# Altium footprint library 2.52-直插元件.PcbLib: 467 footprints (part 27 of 30)
Each footprint in its own frame and in the unit in brackets; x right, y up, seen from the top. Pads: shape width x height; smd on the part's side, far side on the other; paste and mask are expansions set on the pad; w line width, h text height; cw(c..) or ccw(c..) is an arc to the next point about the centre after c.
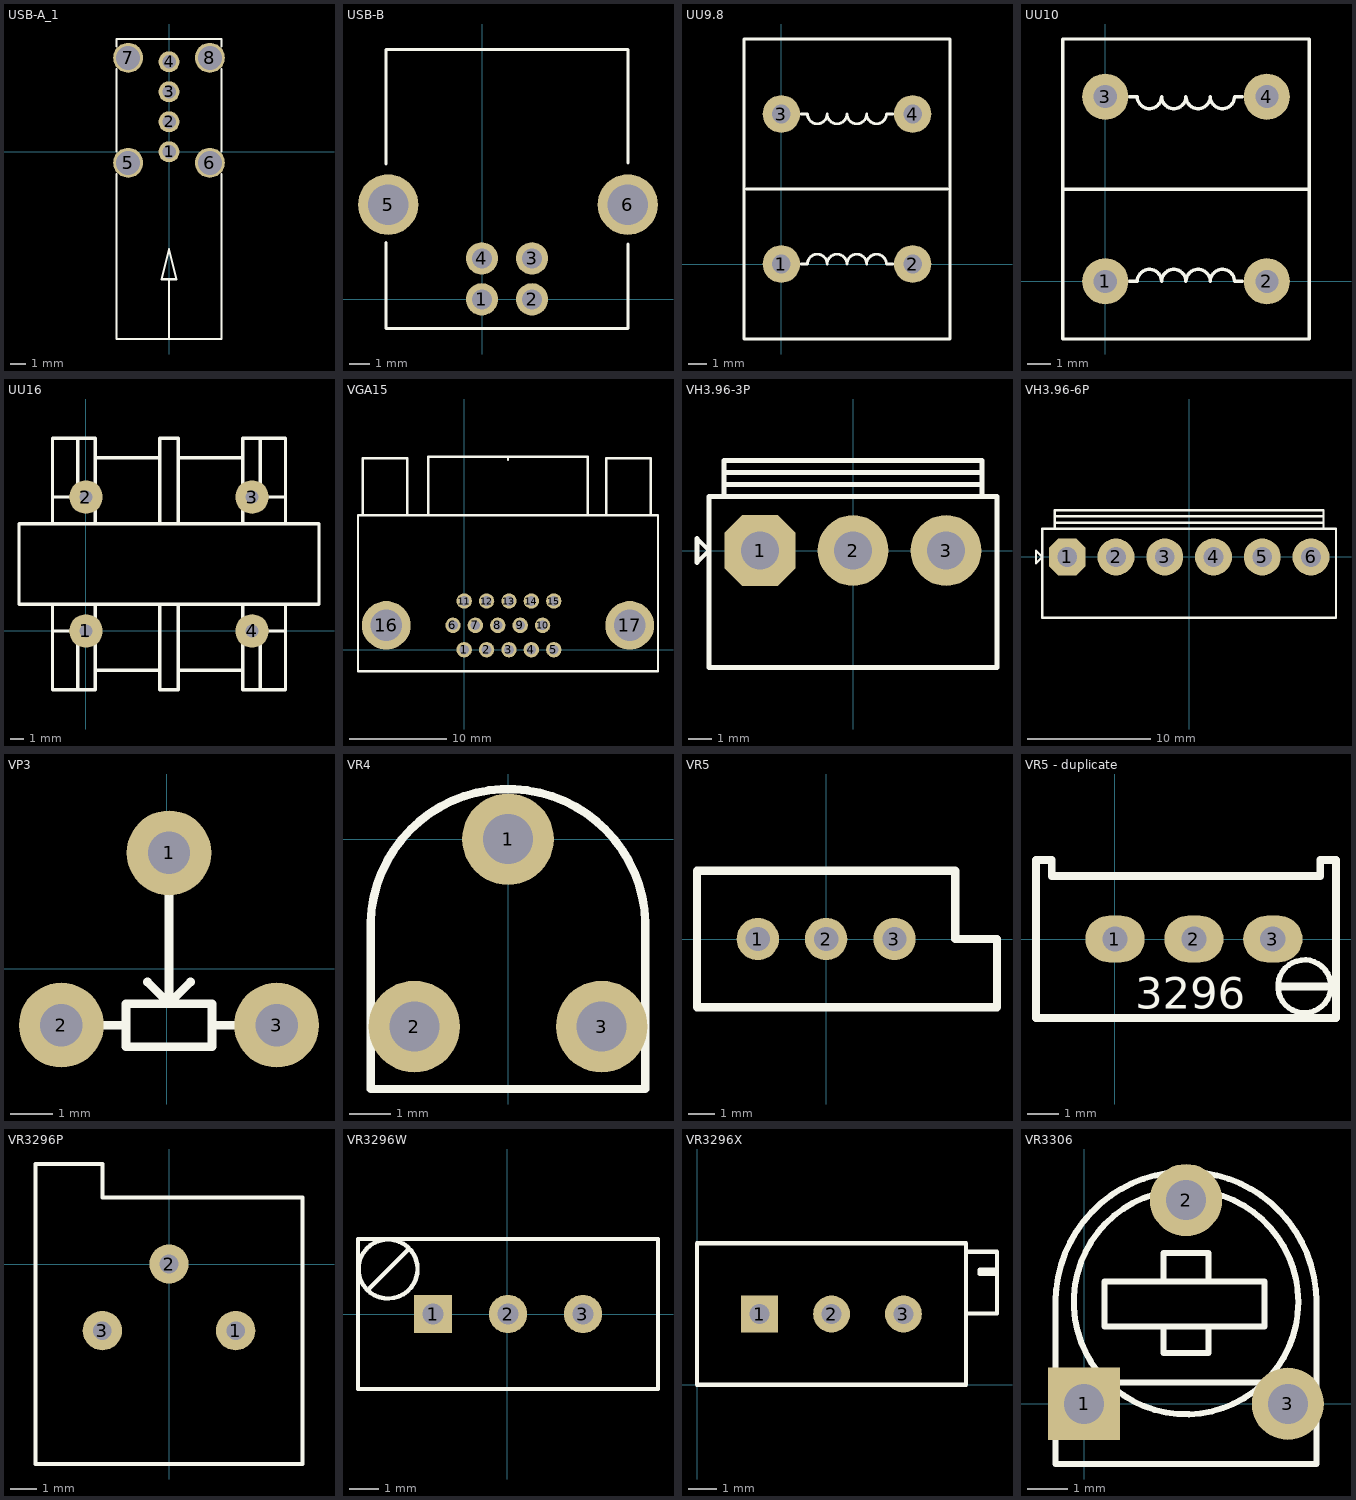
[diagram p26: the footprints below, top view; thin cyan lines are the x and y axes]

## USB-A_1 [mm] "封装库来自淘宝卖家 ID：黄晶宝石"
pads (8):
  round 1.4 hole 0.9: 1(-0.011,-0.003) 2(-0.011,1.997) 3(-0.011,3.997) 4(-0.011,5.997)
  round 2 hole 1.6: 5(-2.731,-0.733) 6(2.709,-0.733) 7(-2.731,6.267) 8(2.709,6.267)
Top Overlay:
  lines w0.15: -3.511,-1.483 -3.511,-12.483 3.489,-12.483 3.489,-1.483 ; -3.511,0.017 -3.511,5.517 ; -3.511,7.017 -3.511,7.517 3.489,7.517 3.489,7.017 ; -0.011,-12.483 -0.011,-8.503 ; 3.489,0.017 3.489,5.517 ; -0.511,-8.503 -0.011,-6.503 0.489,-8.503 -0.511,-8.503
3D body "User Library-USB-STRT-CONN.step": height 14.6, standoff -0.87, extent -3.511,-12.324 3.489,7.026

## USB-B [mil] "封装库来自淘宝卖家 ID：黄晶宝石"
pads (6):
  round 63 hole 39: 1(-0.5,0.04) 2(97.5,0.04) 3(97.5,80.04) 4(-0.5,80.04)
  round 118 hole 78.74: 5(-183.5,185.04) 6(284.5,185.04)
Top Overlay:
  lines w5.91: -187.5,110.54 -187.5,-56.96 284.5,-56.96 284.5,108.54 ; -187.5,264.54 -187.5,488.04 284.5,488.04 284.5,266.54
3D body "User Library-67068-0000-molex.step": height 433.07, standoff -174.07, extent -243.93,-78.42 342.04,590.87

## UU9.8 [mm]
pads (4):
  round 2 hole 1: 1(0,0) 2(7,0) 3(0,8) 4(7,8)
Top Overlay:
  lines w0.15: -2,-4 9,-4 ; -2,-3.991 -2,12 9,12 9,-3.991 ; -1.851,3.998 8.847,3.998 ; 1.045,-0.007 1.388,-0.007 cw(c1.915,-0.007) 2.442,-0.007 cw(c2.969,-0.007) 3.496,-0.007 cw(c4.023,-0.007) 4.55,-0.007 cw(c5.077,-0.007) 5.604,-0.007 5.947,-0.007 ; 1.045,8.007 1.388,8.007 ccw(c1.915,8.007) 2.442,8.007 ccw(c2.969,8.007) 3.496,8.007 ccw(c4.023,8.007) 4.55,8.007 ccw(c5.077,8.007) 5.604,8.007 5.947,8.007
3D body "User Library-emi filter-1.step": height 16.04, standoff -2.96, extent -1.75,-3.746 8.75,11.755

## UU10 [mm] "淘宝ID:黄晶宝石   店铺网址:https://shop463601444.taobao.com"
pads (4):
  round 2 hole 1: 1(0,0) 2(7,0) 3(0,8) 4(7,8)
Top Overlay:
  lines w0.15: -1.851,3.998 8.847,3.998 ; -1.851,10.5 -1.847,-2.5 8.847,-2.5 8.847,10.5 -1.847,10.5 ; 1.045,-0.007 1.388,-0.007 cw(c1.915,-0.007) 2.442,-0.007 cw(c2.969,-0.007) 3.496,-0.007 cw(c4.023,-0.007) 4.55,-0.007 cw(c5.077,-0.007) 5.604,-0.007 5.947,-0.007 ; 1.045,8.007 1.388,8.007 ccw(c1.915,8.007) 2.442,8.007 ccw(c2.969,8.007) 3.496,8.007 ccw(c4.023,8.007) 4.55,8.007 ccw(c5.077,8.007) 5.604,8.007 5.947,8.007
3D body "UU10.STEP": height 15.45, standoff -3, extent -1.925,-3.782 8.925,11.782

## UU16 [mm] "封装库来自淘宝卖家 ID：黄晶宝石"
pads (4):
  round 2.5 hole 1: 1(0,0) 2(0,10) 3(12.4,10) 4(12.4,0)
Top Overlay:
  lines w0.254: -2.5,8 -2.5,9.996 ; 0.7,-2.923 5.5,-2.923 ; 0.7,2 0.7,-4.4 -0.6,-4.4 ; 0.7,8 0.7,14.4 -0.6,14.4 ; 0.7,12.923 5.5,12.923 ; 5.5,2 5.5,-4.4 6.9,-4.4 6.9,2 ; 5.5,8 5.5,14.4 6.9,14.4 6.9,8 ; 6.9,-2.923 11.7,-2.923 ; 6.9,12.923 11.7,12.923 ; 11.7,2 11.7,-4.4 13,-4.4 ; 11.7,8 11.7,14.4 13,14.4 ; -2.5,0 -2.5,2 -2.5,0.004 ; -2.5,0 -2.5,0.004 ; -2.5,0 -0.6,0 -0.6,-4.4 ; -2.5,0 -2.5,0.004 ; -2.5,0.004 -2.5,-4.4 -0.6,-4.4 ; -2.5,9.996 -2.5,10 -0.6,10 -0.6,14.4 ; -2.5,9.996 -2.5,14.4 -0.6,14.4 ; 13,-4.4 13,0 14.9,0 ; 13,-4.4 14.9,-4.4 14.9,0.004 ; 13,14.4 13,10 14.9,10 ; 13,14.4 14.9,14.4 14.9,9.996 ; 14.9,0 14.9,2 14.9,0.004 ; 14.9,0 14.9,0.004 ; 14.9,0 14.9,0.004 ; 14.9,9.996 14.9,10 ; 14.9,9.996 14.9,8 14.9,10 ; 14.9,9.996 14.9,10 ; -5,2 -5,8 17.4,8 17.4,2 -5,2
3D body "UU16.STEP": height 25.55, standoff -3.8, extent -4.917,-4.35 17.317,14.35

## VGA15 [mm]
pads (17):
  round 1.58 hole 1: 1(0,0) 2(2.3,0) 3(4.6,0) 4(6.9,0) 5(9.2,0) 6(-1.15,2.5) 7(1.15,2.5) 8(3.45,2.5) 9(5.75,2.5) 10(8.05,2.5) 11(0,5) 12(2.3,5) 13(4.6,5) 14(6.9,5) 15(9.2,5)
  round 5 hole 3.25: 16(-8,2.5) 17(17,2.5)
Top Overlay:
  lines w0.254: -10.9,-2.2 -10.9,13.8 19.9,13.8 19.9,-2.2 -10.89,-2.2 -10.9,-2.19 ; -10.4,13.8 -10.4,19.67 -5.83,19.67 -5.83,13.82 ; -3.7,13.8 -3.7,19.8 12.7,19.8 12.7,13.8 ; 4.5,19.5 4.5,19.8 ; 14.6,13.8 14.6,19.68 19.18,19.68 19.18,13.84
3D body "SW3dPS-Connector, D-Sub, 15 pin HD, RA, Receptacle.STEP": height 12.77, standoff -3.27, extent -11.055,-0.875 19.755,20.225

## VH3.96-3P [mm] "VH3.96接插件"
height 1.5
pads (3):
  oct 3x3 hole 1.6: 1(-3.937,0)
  round 3 hole 1.6: 2(0,0) 3(3.937,0)
Top Overlay:
  lines w0.2: -5.461,2.286 -5.461,3.81 5.461,3.81 5.461,2.286 ; -5.461,2.794 5.461,2.794 ; -5.461,3.302 5.461,3.302 ; -6.604,-0.508 -6.604,0.508 -6.096,0 -6.604,-0.508 ; -6.096,-4.953 6.096,-4.953 6.096,2.286 -6.096,2.286 -6.096,-4.953

## VH3.96-6P [mm] "CH3.96接插件"
height 1.5
pads (6):
  oct 3x3 hole 1.6: 1(-9.906,0)
  round 3 hole 1.6: 2(-5.944,0) 3(-1.981,0) 4(1.981,0) 5(5.944,0) 6(9.906,0)
Top Overlay:
  lines w0.2: -10.922,2.286 -10.922,3.81 10.922,3.81 10.922,2.286 ; -10.922,2.794 10.922,2.794 ; -10.922,3.302 10.922,3.302 ; -12.446,-0.508 -12.446,0.508 -11.938,0 -12.446,-0.508 ; -11.938,-4.953 11.938,-4.953 11.938,2.286 -11.938,2.286 -11.938,-4.953

## VP3 [mm]
pads (3):
  round 2 hole 1: 1(0.052,2.739) 2(-2.488,-1.325) 3(2.592,-1.325)
Top Overlay:
  lines w0.203: -2.488,-1.325 -0.964,-1.325 ; -0.456,-0.309 0.052,-0.817 ; 0.052,2.739 0.052,-0.817 ; 0.56,-0.309 0.052,-0.817 ; 1.068,-1.325 2.592,-1.325 ; -0.964,-1.325 -0.964,-0.817 1.068,-0.817 1.068,-1.833 -0.964,-1.833 -0.964,-1.325

## VR4 [mm]
pads (3):
  round 2.2 hole 1.2: 1(0,0) 2(-2.25,-4.5) 3(2.25,-4.5)
Top Overlay:
  lines w0.2: -3.3,-6 -3.3,-2 cw(c0,-2.095) 3.3,-2 3.3,-6 -3.3,-6

## VR5 [mil]
pads (3):
  round 62 hole 35.43: 1(-100,0) 2(0,0) 3(100,0)
Top Overlay:
  lines w12: -188.98,-100 -188.98,100 188.98,100 188.98,0 250,0 250,-100 -188.98,-100

## VR5 - duplicate [mm] "封装库来自淘宝卖家 ID：黄晶宝石"
pads (3):
  oval 1.905x1.5 hole 0.813: 1(0,0) 2(2.54,0) 3(5.08,0)
Top Overlay:
  circle w0.178: c6.096,-1.524 r0.852
  lines w0.254: 5.334,-1.524 6.948,-1.524 ; -2.54,-2.54 -2.54,2.54 -2.032,2.54 -2.032,2.032 6.604,2.032 6.604,2.54 7.112,2.54 7.112,-2.54 -2.54,-2.54
  text "3296" at 0.65,-2.25 h1.02
3D body "User Library-67W.STEP": height 12.18, standoff -4.09, extent -2.309,-2.461 7.491,2.489

## VR3296P [mm]
pads (3):
  round 1.5 hole 0.711: 1(2.54,-2.54) 2(0,0) 3(-2.54,-2.54)
Top Overlay:
  lines w0.15: -5.08,-7.62 -5.08,3.81 -2.54,3.81 -2.54,2.54 5.08,2.54 5.08,-7.62 -5.08,-7.62
3D body "3296P.step": height 4.4, standoff -8.69, extent -4.765,-7.776 4.765,3.774

## VR3296W [mm]
pads (3):
  rect 1.3x1.3 hole 0.711: 1(-2.515,0)
  round 1.3 hole 0.711: 2(0.025,0) 3(2.565,0)
Top Overlay:
  circle w0.15: c-4.039,1.524 r1
  lines w0.15: -4.665,0.876 -3.388,2.153 ; -5.055,-2.54 -5.055,0 -5.055,2.54 5.105,2.54 5.105,-2.54 -5.055,-2.54
3D body "3296W.step": height 11.55, standoff -6.4, extent -4.74,-2.415 4.79,2.415

## VR3296X [mm]
pads (3):
  rect 1.3x1.3 hole 0.711: 1(2.21,2.5)
  round 1.3 hole 0.711: 2(4.75,2.5) 3(7.29,2.5)
Top Overlay:
  lines w0.15: 9.5,2.515 10.592,2.515 10.592,4.699 9.5,4.699 ; 10.592,3.2 10.592,3.912 9.982,3.912 9.982,4.064 10.592,4.064 ; 0,0 0,5 9.5,5 9.5,0 0,0
3D body "3296X.step": height 10.03, standoff -6.4, extent -0.013,0.084 11.037,4.915

## VR3306 [mm]
pads (3):
  rect 1.8x1.8 hole 1: 1(0,0)
  round 1.8 hole 1: 2(2.54,5.08) 3(5.08,0)
Top Overlay:
  circle w0.15: c2.54,2.54 r2.801
  lines w0.15: -0.711,-1.5 5.789,-1.5 5.789,2.539 ; -0.71,-1.499 -0.71,2.54 cw(c2.54,2.54) 5.79,2.54 ; 0.61,0.533 4.572,0.533 ; 1.981,1.93 1.981,1.27 3.099,1.27 3.099,1.93 ; 1.981,3.099 1.981,3.759 3.099,3.759 3.099,3.099 ; 0.508,1.93 4.496,1.93 4.496,3.048 0.508,3.048 0.508,1.93
3D body "User Library-Trimmer, 3306F-1.STEP": height 7.62, standoff -3.04, extent -0.865,-2.294 5.945,5.957